# Altium footprint library LimeMicroAltiumLib_pcbLib_r01.PcbLib: 434 footprints (part 18 of 29)
Each footprint in its own frame and in the unit in brackets; x right, y up, seen from the top. Pads: shape width x height; smd on the part's side, far side on the other; paste and mask are expansions set on the pad; w line width, h text height; cw(c..) or ccw(c..) is an arc to the next point about the centre after c.
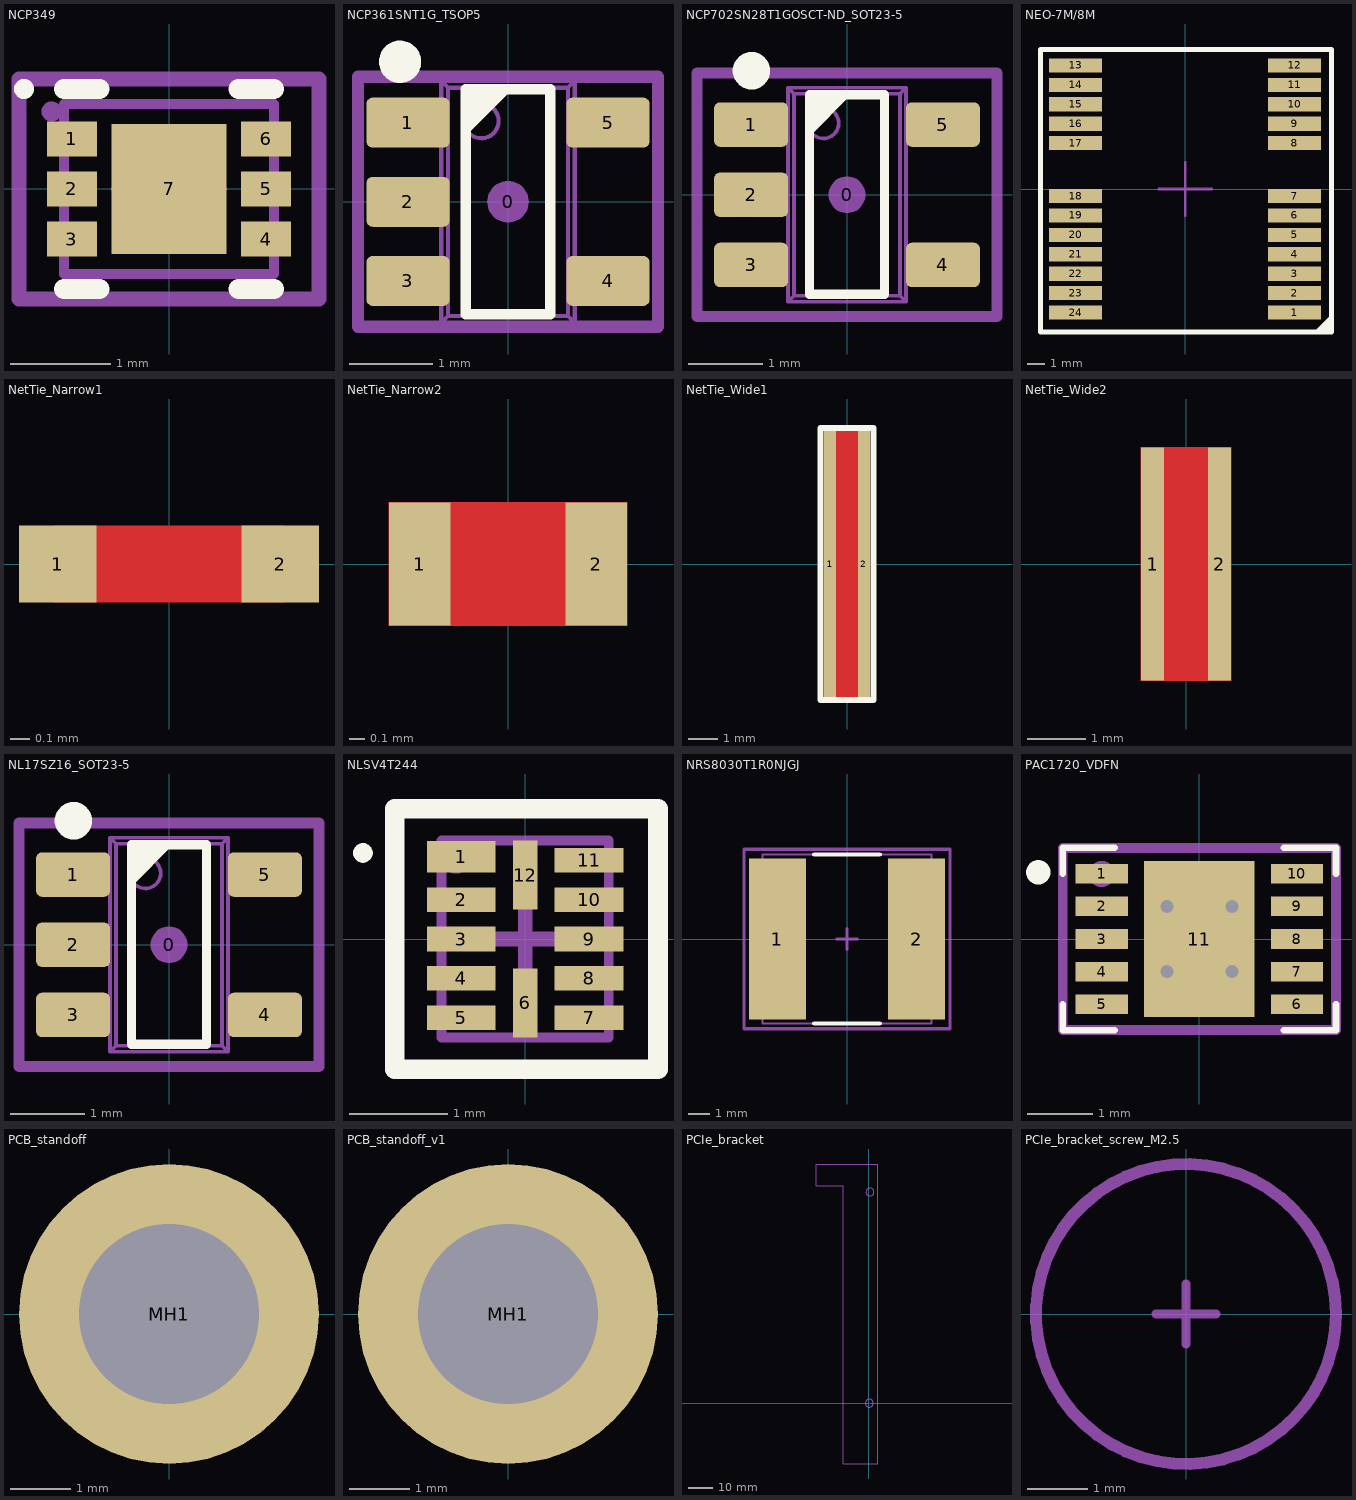
[diagram p17: the footprints below, top view; thin cyan lines are the x and y axes]

## NCP349 [mm] "SON, 6-Leads, Body 1,60x2,00mm, Pitch 0,50mm, Thermal Pad 1,20x0,79mm, IPC Medium Density"
height 1
pads (7):
  rect 0.5x0.35 smd mask+0.05: 1(-0.97,0.5) 2(-0.97,0) 3(-0.97,-0.5) 4(0.97,-0.5) 5(0.97,0) 6(0.97,0.5)
  rect 1.15x1.3 smd mask+0.05: 7(0,0)
Top Overlay:
  circle w0.1: c-1.45,1 r0.05
  lines w0.2: -1.05,-1 -0.695,-1 ; -1.05,1 -0.695,1 ; 0.695,-1 1.05,-1 ; 0.695,1 1.05,1
Top Solder:
  region: -1.275,-0.725 1.275,-0.725 1.275,0.725 -1.275,0.725
Mechanical 13:
  lines w0.1: -1.05,-0.85 1.05,-0.85 1.05,0.85 -1.05,0.85 -1.05,-0.85
Mechanical 15:
  circle w0.1: c-1.175,0.775 r0.05
  lines w0.15: -0.5,0 0.5,0 ; 0,-0.5 0,0.5 ; -1.5,-1.1 1.5,-1.1 1.5,1.1 -1.5,1.1 -1.5,-1.1
  text ".Designator" at 0,0 h0.55
3D body: height 1, standoff 0.1, extent -1.05,-0.85 1.05,0.85

## NCP361SNT1G_TSOP5 [mm]
height 1.6
pads (6):
  round 0.5 on Mech15: 0(0,0)
  rrect25% 1x0.6 smd: 1(-1.2,0.95) 2(-1.2,0) 3(-1.2,-0.95) 4(1.2,-0.95) 5(1.2,0.95)
Top Overlay:
  circle w0.254: c-1.295,1.68 r0.127
  region: -0.508,1.353 0.053,1.353 -0.508,0.792
  lines w0.127: -0.508,-1.347 -0.508,1.353 0.508,1.353 0.508,-1.347 -0.508,-1.347
Mechanical 13:
  circle w0.05: c-0.32,0.97 r0.208
  lines w0.05: -1.191,-1.15 -1.191,-0.75 ; -1.191,-0.2 -1.191,0.2 ; -1.191,0.75 -1.191,1.15 ; -1.1,-1.15 -1.1,-0.75 ; -1.1,-0.2 -1.1,0.2 ; -1.1,0.75 -1.1,1.15 ; -1.094,-1.15 -1.094,-0.75 ; -1.094,-0.2 -1.094,0.2 ; -1.094,0.75 -1.094,1.15 ; -0.844,-1.15 -0.844,-0.75 ; -0.844,-0.2 -0.844,0.2 ; -0.844,0.75 -0.844,1.15 ; -0.8,-1.15 -1.4,-1.15 -1.4,-0.75 -0.8,-0.75 ; -0.8,-0.2 -1.4,-0.2 -1.4,0.2 -0.8,0.2 ; -0.8,0.75 -1.4,0.75 -1.4,1.15 -0.8,1.15 ; 0.8,-1.15 1.4,-1.15 1.4,-0.75 0.8,-0.75 ; 0.8,0.75 1.4,0.75 1.4,1.15 0.8,1.15 ; 0.844,-1.15 0.844,-0.75 ; 0.844,0.75 0.844,1.15 ; 1.094,-1.15 1.094,-0.75 ; 1.094,0.75 1.094,1.15 ; 1.1,-1.15 1.1,-0.75 ; 1.1,0.75 1.1,1.15 ; 1.191,-1.15 1.191,-0.75 ; 1.191,0.75 1.191,1.15 ; -0.8,-1.45 -0.8,1.45 ; -0.8,-1.45 -0.719,-1.369 ; -0.8,-1.45 0.8,-1.45 ; -0.8,1.45 -0.719,1.369 ; -0.8,1.45 0.8,1.45 ; -0.719,-1.369 0.719,-1.369 ; -0.719,-1.369 -0.719,1.369 ; -0.719,1.369 0.719,1.369 ; 0.719,-1.369 0.8,-1.45 ; 0.719,-1.369 0.719,1.369 ; 0.719,1.369 0.8,1.45 ; 0.8,-1.45 0.8,1.45
Mechanical 15:
  circle w0.35: c-1.2,0.95 r0.079
  lines w0.15: -1.8,-1.5 -1.8,1.5 1.8,1.5 1.8,-1.5 -1.8,-1.5
  text ".Designator" at 0,0 h0.55
3D body "SOT23-5.STEP": height 1.44, standoff -0.01, extent -1.4,-1.45 1.4,1.45

## NCP702SN28T1GOSCT-ND_SOT23-5 [mm]
height 1.6
pads (6):
  round 0.5 on Mech15: 0(0,0)
  rrect25% 1x0.6 smd: 1(-1.3,0.95) 2(-1.3,0) 3(-1.3,-0.95) 4(1.3,-0.95) 5(1.3,0.95)
Top Overlay:
  circle w0.254: c-1.295,1.68 r0.127
  region: -0.508,1.353 0.053,1.353 -0.508,0.792
  lines w0.127: -0.508,-1.347 -0.508,1.353 0.508,1.353 0.508,-1.347 -0.508,-1.347
Mechanical 13:
  circle w0.05: c-0.32,0.97 r0.208
  lines w0.05: -1.191,-1.15 -1.191,-0.75 ; -1.191,-0.2 -1.191,0.2 ; -1.191,0.75 -1.191,1.15 ; -1.1,-1.15 -1.1,-0.75 ; -1.1,-0.2 -1.1,0.2 ; -1.1,0.75 -1.1,1.15 ; -1.094,-1.15 -1.094,-0.75 ; -1.094,-0.2 -1.094,0.2 ; -1.094,0.75 -1.094,1.15 ; -0.844,-1.15 -0.844,-0.75 ; -0.844,-0.2 -0.844,0.2 ; -0.844,0.75 -0.844,1.15 ; -0.8,-1.15 -1.4,-1.15 -1.4,-0.75 -0.8,-0.75 ; -0.8,-0.2 -1.4,-0.2 -1.4,0.2 -0.8,0.2 ; -0.8,0.75 -1.4,0.75 -1.4,1.15 -0.8,1.15 ; 0.8,-1.15 1.4,-1.15 1.4,-0.75 0.8,-0.75 ; 0.8,0.75 1.4,0.75 1.4,1.15 0.8,1.15 ; 0.844,-1.15 0.844,-0.75 ; 0.844,0.75 0.844,1.15 ; 1.094,-1.15 1.094,-0.75 ; 1.094,0.75 1.094,1.15 ; 1.1,-1.15 1.1,-0.75 ; 1.1,0.75 1.1,1.15 ; 1.191,-1.15 1.191,-0.75 ; 1.191,0.75 1.191,1.15 ; -0.8,-1.45 -0.8,1.45 ; -0.8,-1.45 -0.719,-1.369 ; -0.8,-1.45 0.8,-1.45 ; -0.8,1.45 -0.719,1.369 ; -0.8,1.45 0.8,1.45 ; -0.719,-1.369 0.719,-1.369 ; -0.719,-1.369 -0.719,1.369 ; -0.719,1.369 0.719,1.369 ; 0.719,-1.369 0.8,-1.45 ; 0.719,-1.369 0.719,1.369 ; 0.719,1.369 0.8,1.45 ; 0.8,-1.45 0.8,1.45
Mechanical 15:
  circle w0.35: c-1.375,0.95 r0.025
  lines w0.15: -2.032,-1.651 -2.032,1.651 2.032,1.651 2.032,-1.651 -2.032,-1.651
  text ".Designator" at 0,0 h0.55
3D body "SOT23-5.STEP": height 1.44, standoff -0.01, extent -1.4,-1.45 1.4,1.45

## NEO-7M/8M [mm]
pads (24):
  rect 3x0.8 smd: 1(6.2,-7) 2(6.2,-5.9) 3(6.2,-4.8) 4(6.2,-3.7) 5(6.2,-2.6) 6(6.2,-1.5) 7(6.2,-0.4) 8(6.2,2.6) 9(6.2,3.7) 10(6.2,4.8) 11(6.2,5.9) 12(6.2,7) 13(-6.2,7) 14(-6.2,5.9) 15(-6.2,4.8) 16(-6.2,3.7) 17(-6.2,2.6) 18(-6.2,-0.4) 19(-6.2,-1.5) 20(-6.2,-2.6) 21(-6.2,-3.7) 22(-6.2,-4.8) 23(-6.2,-5.9) 24(-6.2,-7)
Top Overlay:
  region: 7.5,-8.1 8.3,-7.3 8.3,-8.1
  lines w0.3: 7.5,-8.1 8.3,-7.3 ; -8.2,-8.1 -8.2,7.9 8.3,7.9 8.3,-8.1 -8.2,-8.1
Mechanical 15:
  circle w0.4: c6.2,-7 r0.1
  lines w0.15: -1.5,0 1.5,0 ; 0,-1.5 0,1.5 ; -8.2,-8.1 -8.2,7.9 8.3,7.9 8.3,-8.1 -8.2,-8.1
  text ".Designator" at 0,0 h0.55
3D body "NEO.STEP": height 2.33, standoff 0, extent -6.1,-8 6.1,8

## NetTie_Narrow1 [mm]
pads (2):
  rect 0.4x0.4 smd: 1(-0.575,0) 2(0.575,0)
Top Layer:
  lines w0.4: -0.575,0 0.575,0

## NetTie_Narrow2 [mm]
pads (2):
  rect 0.4x0.8 smd: 1(-0.575,0) 2(0.575,0)
Top Layer:
  region: -0.775,0.4 -0.775,-0.4 0.775,-0.4 0.775,0.4

## NetTie_Wide1 [mm]
pads (2):
  rect 0.4x9 smd: 1(-0.575,0) 2(0.575,0)
Top Layer:
  region: -0.775,4.5 -0.775,-4.5 0.775,-4.5 0.775,4.5
Top Overlay:
  lines w0.2: -0.9,-4.6 -0.9,4.6 0.9,4.6 0.9,-4.6 -0.9,-4.6

## NetTie_Wide2 [mm]
pads (2):
  rect 0.4x4 smd: 1(-0.575,0) 2(0.575,0)
Top Layer:
  region: -0.775,2 -0.775,-2 0.775,-2 0.775,2

## NL17SZ16_SOT23-5 [mm]
height 1.6
pads (6):
  round 0.5 on Mech15: 0(0,0)
  rrect25% 1x0.6 smd: 1(-1.3,0.95) 2(-1.3,0) 3(-1.3,-0.95) 4(1.3,-0.95) 5(1.3,0.95)
Top Overlay:
  circle w0.254: c-1.295,1.68 r0.127
  region: -0.508,1.353 0.053,1.353 -0.508,0.792
  lines w0.127: -0.508,-1.347 0.508,-1.347 0.508,1.353 -0.508,1.353 -0.508,-1.347
Mechanical 13:
  circle w0.05: c-0.32,0.97 r0.208
  lines w0.05: -1.191,-1.15 -1.191,-0.75 ; -1.191,-0.2 -1.191,0.2 ; -1.191,0.75 -1.191,1.15 ; -1.1,-1.15 -1.1,-0.75 ; -1.1,-0.2 -1.1,0.2 ; -1.1,0.75 -1.1,1.15 ; -1.094,-1.15 -1.094,-0.75 ; -1.094,-0.2 -1.094,0.2 ; -1.094,0.75 -1.094,1.15 ; -0.844,-1.15 -0.844,-0.75 ; -0.844,-0.2 -0.844,0.2 ; -0.844,0.75 -0.844,1.15 ; -0.8,-1.15 -1.4,-1.15 -1.4,-0.75 -0.8,-0.75 ; -0.8,-0.2 -1.4,-0.2 -1.4,0.2 -0.8,0.2 ; -0.8,0.75 -1.4,0.75 -1.4,1.15 -0.8,1.15 ; 0.8,-1.15 1.4,-1.15 1.4,-0.75 0.8,-0.75 ; 0.8,0.75 1.4,0.75 1.4,1.15 0.8,1.15 ; 0.844,-1.15 0.844,-0.75 ; 0.844,0.75 0.844,1.15 ; 1.094,-1.15 1.094,-0.75 ; 1.094,0.75 1.094,1.15 ; 1.1,-1.15 1.1,-0.75 ; 1.1,0.75 1.1,1.15 ; 1.191,-1.15 1.191,-0.75 ; 1.191,0.75 1.191,1.15 ; -0.8,-1.45 0.8,-1.45 ; -0.8,-1.45 -0.719,-1.369 ; -0.8,-1.45 -0.8,1.45 ; -0.8,1.45 0.8,1.45 ; -0.8,1.45 -0.719,1.369 ; -0.719,-1.369 -0.719,1.369 ; -0.719,-1.369 0.719,-1.369 ; -0.719,1.369 0.719,1.369 ; 0.719,-1.369 0.719,1.369 ; 0.719,-1.369 0.8,-1.45 ; 0.719,1.369 0.8,1.45 ; 0.8,-1.45 0.8,1.45
Mechanical 15:
  circle w0.35: c-1.3,0.875 r0.025
  lines w0.15: -2.032,-1.651 2.032,-1.651 2.032,1.651 -2.032,1.651 -2.032,-1.651
  text ".Designator" at 0,0 h0.55
3D body "SOT23-5.STEP": height 1.44, standoff -0.01, extent -1.4,-1.45 1.4,1.45

## NLSV4T244 [mm] "PQFN, 12-Leads, Body 1,70x2,00mm, Pitch 0,40mm, IPC Medium Density"
height 0.55
pads (12):
  rect 0.7x0.32 smd mask+0.05: 1(-0.65,0.835)
  rect 0.7x0.25 smd mask+0.05: 2(-0.65,0.4) 3(-0.65,0) 4(-0.65,-0.4) 5(-0.65,-0.8) 7(0.65,-0.8) 8(0.65,-0.4) 9(0.65,0) 10(0.65,0.4) 11(0.65,0.8)
  rect 0.25x0.7 smd mask+0.05: 6(0,-0.65) 12(0,0.65)
Top Overlay:
  circle w0.1: c-1.65,0.875 r0.05
  lines w0.2: -1.325,-1.325 1.35,-1.325 1.35,1.325 -1.325,1.325 -1.325,-1.325
Mechanical 13:
  lines w0.1: -0.85,-1 0.85,-1 0.85,1 -0.85,1 -0.85,-1
Mechanical 15:
  circle w0.2: c-0.7,0.8 r0.035
  lines w0.15: -0.5,0 0.5,0 ; 0,-0.5 0,0.5 ; -1.325,-1.325 1.35,-1.325 1.35,1.325 -1.325,1.325 -1.325,-1.325
  text ".Designator" at 0,0 h0.55
3D body: height 0.55, standoff 0, extent -0.85,-1 0.85,1

## NRS8030T1R0NJGJ [mm] "Precision Wire Wound Inductor, 2-Leads, Body 8,00x8,00mm, IPC Medium Density"
height 3
pads (2):
  rect 2.7x7.6 smd: 1(-3.3,0) 2(3.3,0)
Top Overlay:
  lines w0.2: -1.55,-4 1.55,-4 ; -1.55,4 1.55,4
Mechanical 13:
  lines w0.1: -4,-4 4,-4 4,4 -4,4 -4,-4
Mechanical 15:
  lines w0.15: -0.5,0 0.5,0 ; 0,-0.5 0,0.5 ; -4.875,-4.25 4.875,-4.25 4.875,4.25 -4.875,4.25 -4.875,-4.25
  text ".Designator" at 0,0 h0.55
3D body: height 3, standoff 0, extent -4,-4 4,4

## PAC1720_VDFN [mm] "10-Lead Very Thin Plastic Dual Flat, No Lead Package (9Q) - 3x3 mm Body [VDFN]"
pads (11):
  rect 0.8x0.3 smd mask+0.05: 1(-1.5,1) 2(-1.5,0.5) 3(-1.5,0) 4(-1.5,-0.5) 5(-1.5,-1) 6(1.5,-1) 7(1.5,-0.5) 8(1.5,0) 9(1.5,0.5) 10(1.5,1)
  rect 1.7x2.4 smd mask+0.05: 11(0,0)
via -0.5,0.5 diameter 0.4 hole 0.2
via 0.5,0.5 diameter 0.4 hole 0.2
via 0.5,-0.5 diameter 0.4 hole 0.2
via -0.5,-0.5 diameter 0.4 hole 0.2
Top Overlay:
  circle w0.3: c-2.475,1.025 r0.035
  lines w0.1: -2.1,-1 -2.1,-1.4 -1.3,-1.4 ; -2.1,1 -2.1,1.4 -1.3,1.4 ; 1.3,-1.4 2.1,-1.4 2.1,-1 ; 1.3,1.4 2.1,1.4 2.1,1
Mechanical 15:
  circle w0.3: c-1.5,1 r0.05
  lines w0.15: -0.3,0 0.3,0 ; 0,-0.3 0,0.3 ; -2.1,-1.4 2.1,-1.4 2.1,1.4 -2.1,1.4 -2.1,-1.4
  text ".Designator" at 0,0 h0.55
3D body "User Library-My-DFN-10-3x3-0_5.STEP": height 0.8, standoff 0, extent -1.56,-1.55 1.56,1.55

## PCB_standoff [mm]
pads (1):
  round 5 hole 3: MH1(0,0)
Top Paste:
  drawing of 32 lines, arcs and shapes, not listed
Bottom Paste:
  drawing of 32 lines, arcs and shapes, not listed
Mechanical 15:
  lines w0.15: -2.2,0 0,0 ; 0,-2.2 0,0 ; 0,2.2 0,0 ; 2.2,0 0,0
  text ".Designator" at 0,0 h0.55
3D body "Hex Spacer MF M3 L5mm.stp": height 5.2, standoff -5.8, extent -2.862,-2.5 2.912,2.5

## PCB_standoff_v1 [mm]
pads (1):
  round 5 hole 3: MH1(0,0)
Top Paste:
  drawing of 32 lines, arcs and shapes, not listed
Bottom Paste:
  drawing of 32 lines, arcs and shapes, not listed
Mechanical 15:
  lines w0.15: -2.2,0 0,0 ; 0,-2.2 0,0 ; 0,2.2 0,0 ; 2.2,0 0,0
  text ".Designator" at 0,0 h0.55
3D body "14952.stp": height 6.5, standoff -2.95, extent -3.2,-3.2 3.2,3.2

## PCIe_bracket [mm]
Mechanical 1:
  circle w0.25: c0.525,85.4 r1.601
  circle w0.25: c0.275,0 r1.601
Mechanical 15:
  circle w0.25: c0.275,0 r1.601
  circle w0.25: c0.525,85.4 r1.601
  lines w0.15: -21.2,87.975 -21.2,96.725 3.7,96.725 3.7,-24.575 -10.225,-24.575 -10.225,87.975 -21.2,87.975
  text ".Designator" at -6.075,-23.825 h0.55
  text "Screws are threaded from the top side." at -8,58 h0.9
  text "PCIe bracket assembly : bracket is mounted on the bottom PCB side and screwed in two places." at -8.075,-23.875 h0.9
3D body "PCIE card IO panel_v2.STEP": height 14.99, standoff -6.6, extent -20.405,-24.518 3.598,96.795
3D body "User Library-SMA-2.step": height 11.25, standoff 0.75, extent -18.625,69.4 16.375,79.9
3D body "User Library-SMA-2.step": height 11.25, standoff 0.75, extent -18.625,57.15 16.375,67.65
3D body "User Library-SMA-2.step": height 11.25, standoff 0.75, extent -18.625,44.9 16.375,55.4
3D body "User Library-SMA-2.step": height 11.25, standoff 0.75, extent -18.625,32.65 16.375,43.15
3D body "User Library-SMA-2.step": height 11.25, standoff 0.75, extent -18.625,20.4 16.375,30.9
3D body "User Library-SMA-2.step": height 11.25, standoff 0.75, extent -18.625,8.15 16.375,18.65
3D body "User Library-SMA-2.step": height 11.25, standoff 0.75, extent -18.625,82.15 16.375,92.65
3D body "User Library-SMA-2.step": height 11.25, standoff 0.75, extent -18.625,-4.1 16.375,6.4

## PCIe_bracket_screw_M2.5 [mm]
Mechanical 15:
  circle w0.2: c0,0 r2.5
  lines w0.15: -0.5,0 0.5,0 ; 0,-0.5 0,0.5
  text ".Designator" at 0,0 h0.55
3D body "User Library-M2_5-A4-socket-cap-screw-din 912.step": height 2.5, standoff -6, extent -2.25,-2.25 2.25,2.25